# Altium footprint library connectors.PcbLib: 256 footprints (part 7 of 16)
Each footprint in its own frame and in the unit in brackets; x right, y up, seen from the top. Pads: shape width x height; smd on the part's side, far side on the other; paste and mask are expansions set on the pad; w line width, h text height; cw(c..) or ccw(c..) is an arc to the next point about the centre after c.
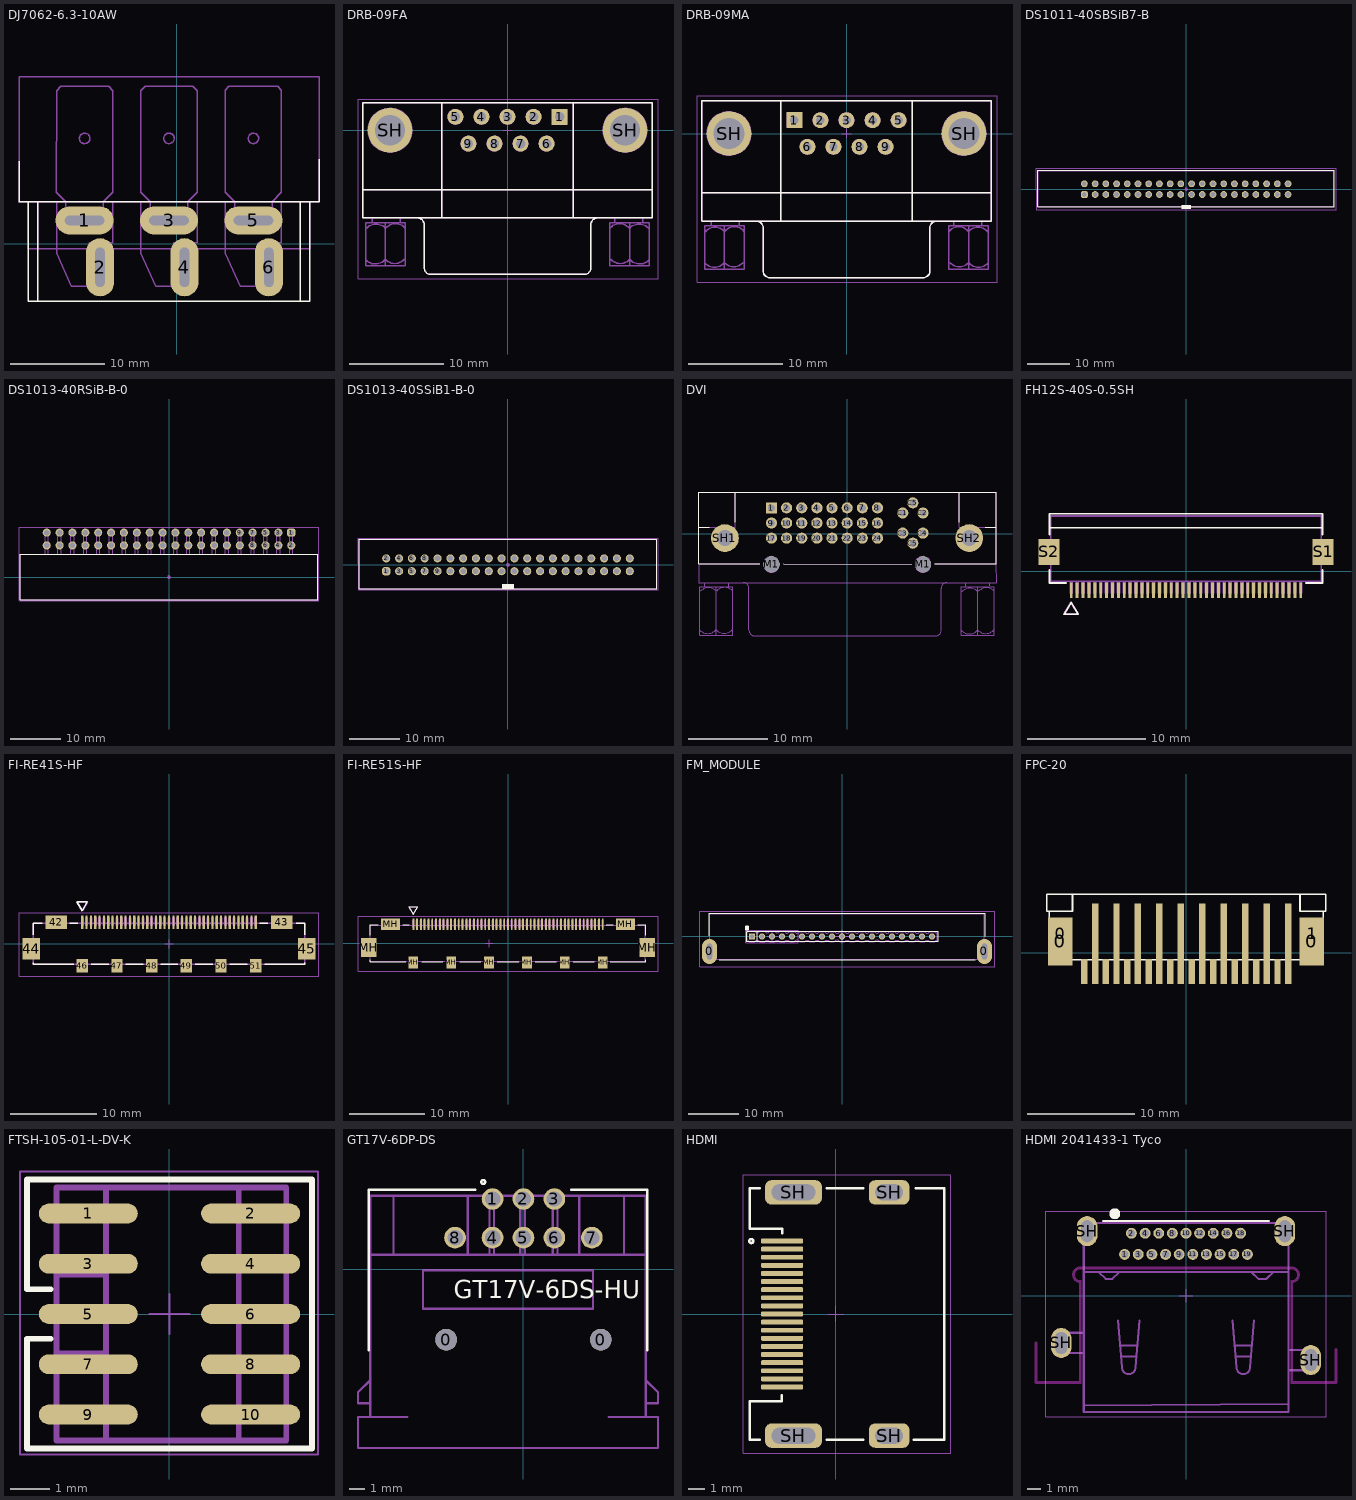
[diagram p6: the footprints below, top view; thin cyan lines are the x and y axes]

## DJ7062-6.3-10AW [mm] "DJ7062-6.3-10AW"
height 18
pads (6):
  oval 6.2x3 hole 1 slot 4.2 at 0 deg: 1(-9.825,2.5) 3(-0.825,2.5) 5(8.175,2.5)
  oval 3x6.2 hole 1 slot 4.2 at 90 deg: 2(-8.175,-2.5) 4(0.825,-2.5) 6(9.825,-2.5)
Top Overlay:
  lines w0.15: -16.825,8.8 -16.825,4.5 ; -15.825,4.5 -15.825,-6.1 14.175,-6.1 14.175,4.5 ; -14.825,-6.1 -14.825,4.5 ; 13.175,-6.1 13.175,4.5 ; 15.175,9 15.175,4.5 -16.825,4.5 ; -16.825,4.5 -16.825,4.5
TopAssy 13:
  circle w0.15: c8.175,11.25 r0.559
  circle w0.15: c-0.825,11.25 r0.559
  circle w0.15: c-9.825,11.25 r0.559
  lines w0.15: -15.825,4.5 -15.825,-0.5 14.175,-0.5 14.175,4.5 ; -14.825,-0.5 -14.825,4.5 ; -12.825,4.5 -12.825,-1 -11.25,-4.5 -7.875,-4.5 -7.875,-0.5 ; -11.825,2.75 -7.825,2.75 ; -9.325,-0.5 -9.325,0.1 -6.825,0.1 -6.825,4.5 ; -8.375,-4.5 -8.375,-0.5 ; -3.825,4.5 -3.825,-1 -2.25,-4.5 1.125,-4.5 1.125,-0.5 ; -2.825,2.75 1.175,2.75 ; -0.325,-0.5 -0.325,0.1 2.175,0.1 2.175,4.5 ; 0.625,-4.5 0.625,-0.5 ; 5.175,4.5 5.175,-1 6.75,-4.5 10.125,-4.5 10.125,-0.5 ; 6.175,2.75 10.175,2.75 ; 8.675,-0.5 8.675,0.1 11.175,0.1 11.175,4.5 ; 9.625,-4.5 9.625,-0.5 ; 13.175,-0.5 13.175,4.5 ; -16.825,4.5 -16.825,17.8 15.175,17.8 15.175,4.5 -16.825,4.5 ; -12.825,5.5 -11.825,4.5 -11.825,2.25 -7.825,2.25 -7.825,4.5 -6.825,5.5 -6.825,16.35 -7.275,16.8 -12.375,16.8 -12.825,16.35 -12.825,5.5 ; -3.825,5.5 -2.825,4.5 -2.825,2.25 1.175,2.25 1.175,4.5 2.175,5.5 2.175,16.35 1.725,16.8 -3.375,16.8 -3.825,16.35 -3.825,5.5 ; 5.175,5.5 5.175,16.4 5.575,16.8 10.775,16.8 11.175,16.4 11.175,5.5 10.175,4.5 10.175,2.25 6.175,2.25 6.175,4.5 5.175,5.5

## DRB-09FA [mm] "Connector, D-Sub R/A  Female Connector, 2.77 mm Pitch"
height 12.4
pads (11):
  rect 1.69x1.69 hole 1: 1(5.54,1.42)
  round 1.69 hole 1: 2(2.77,1.42) 3(0,1.42) 4(-2.77,1.42) 5(-5.54,1.42) 6(4.155,-1.42) 7(1.385,-1.42) 8(-1.385,-1.42) 9(-4.155,-1.42)
  round 4.76 hole 3.2: SH(-12.495,0) SH(12.495,0)
Top Overlay:
  lines w0.15: -15.4,-9.324 15.4,-9.324 15.4,2.9 -15.4,2.9 -15.4,-9.3 ; -15.4,-6.324 15.4,-6.324 ; -9.56,-9.329 cw(c-9.56,-10.024) -8.865,-10.024 -8.865,-14.624 ; -8.86,-14.629 ccw(c-8.165,-14.629) -8.165,-15.324 8.165,-15.324 ccw(c8.165,-14.629) 8.86,-14.629 ; -7,-9.324 -7,2.9 ; 7,-9.3 7,2.9 ; 8.865,-14.624 8.865,-10.024 cw(c9.56,-10.024) 9.56,-9.329
TopAssy 13:
  circle w0.15: c-2.77,1.42 r0.773
  circle w0.15: c0,1.42 r0.773
  circle w0.15: c2.77,1.42 r0.773
  circle w0.15: c-5.54,1.42 r0.773
  circle w0.15: c4.155,-1.42 r0.773
  circle w0.15: c1.385,-1.42 r0.773
  circle w0.15: c-1.385,-1.42 r0.773
  circle w0.15: c-4.155,-1.42 r0.773
  circle w0.15: c-12.495,0 r2.327
  circle w0.15: c12.495,0 r2.327
  lines w0.15: -15.4,-9.324 15.4,-9.324 15.4,2.9 -15.4,2.9 -15.4,-9.3 ; -15.4,-6.324 15.4,-6.324 ; -15.055,-13.779 ccw(c-14.054,-12.872) -13.047,-13.773 ; -14.99,-10.424 cw(c-13.983,-11.325) -12.981,-10.418 ; -14.4,-9.824 -14.4,-9.324 ; -12.998,-13.73 ccw(c-11.997,-12.823) -10.99,-13.724 ; -12.99,-14.424 -12.99,-9.824 ; -12.933,-10.375 cw(c-11.926,-11.276) -10.925,-10.369 ; -11.4,-9.824 -11.4,-9.324 ; -9.56,-9.329 cw(c-9.56,-10.024) -8.865,-10.024 -8.865,-14.624 ; -8.86,-14.629 ccw(c-8.165,-14.629) -8.165,-15.324 8.165,-15.324 ccw(c8.165,-14.629) 8.86,-14.629 ; -7,-9.324 -7,2.9 ; 7,-9.324 7,2.9 ; 8.865,-14.624 8.865,-10.024 cw(c9.56,-10.024) 9.56,-9.329 ; 10.925,-10.369 cw(c11.926,-11.276) 12.933,-10.375 ; 10.99,-13.724 ccw(c11.997,-12.823) 12.999,-13.73 ; 11.4,-9.824 11.4,-9.324 ; 12.981,-10.418 cw(c13.983,-11.325) 14.99,-10.424 ; 12.99,-14.424 12.99,-9.824 ; 13.047,-13.773 ccw(c14.054,-12.872) 15.055,-13.779 ; 14.4,-9.824 14.4,-9.324 ; -15.09,-14.424 -10.89,-14.424 -10.89,-9.824 -15.09,-9.824 -15.09,-14.424 ; 4.79,0.67 4.79,2.17 6.29,2.17 6.29,1.42 6.29,0.67 4.79,0.67 ; 10.89,-14.424 10.89,-9.824 15.09,-9.824 15.09,-14.424 10.89,-14.424
TopCourt 15:
  lines w0.05: -0.5,0 0.5,0 ; 0,-0.5 0,0.5 ; -15.9,-15.8 16,-15.8 16,3.3 -15.9,3.3 -15.9,-15.8
3D body "User Library-DB9-Usa.step": height 12.47, standoff -4.4, extent -15.405,-15.312 15.405,2.988

## DRB-09MA [mm] "Connector, D-Sub R/A  Male Connector, 2.77 mm Pitch"
height 12.5
pads (11):
  rect 1.69x1.69 hole 0.9: 1(-5.54,1.42)
  round 1.69 hole 0.9: 2(-2.77,1.42) 3(0,1.42) 4(2.77,1.42) 5(5.54,1.42) 6(-4.155,-1.42) 7(-1.385,-1.42) 8(1.385,-1.42) 9(4.155,-1.42)
  round 4.76 hole 3.3: SH(-12.495,0) SH(12.495,0)
Top Overlay:
  lines w0.15: -15.4,-9.324 15.4,-9.324 15.4,3.5 -15.4,3.5 -15.4,-9.3 ; -15.4,-6.324 15.4,-6.324 ; -9.56,-9.329 cw(c-9.56,-10.024) -8.865,-10.024 -8.865,-14.624 ; -8.86,-14.629 ccw(c-8.165,-14.629) -8.165,-15.324 8.165,-15.324 ccw(c8.165,-14.629) 8.86,-14.629 ; -7,-9.324 -7,3.5 ; 7,-9.3 7,3.5 ; 8.865,-14.624 8.865,-10.024 cw(c9.56,-10.024) 9.56,-9.329
TopAssy 13:
  circle w0.15: c12.495,0 r2.327
  circle w0.15: c-12.495,0 r2.327
  circle w0.15: c-4.155,-1.42 r0.773
  circle w0.15: c-1.385,-1.42 r0.773
  circle w0.15: c1.385,-1.42 r0.773
  circle w0.15: c4.155,-1.42 r0.773
  circle w0.15: c5.54,1.42 r0.773
  circle w0.15: c2.77,1.42 r0.773
  circle w0.15: c0,1.42 r0.773
  circle w0.15: c-2.77,1.42 r0.773
  lines w0.15: -15.4,-9.324 15.4,-9.324 15.4,3.5 -15.4,3.5 -15.4,-9.3 ; -15.4,-6.324 15.4,-6.324 ; -15.055,-13.779 ccw(c-14.054,-12.872) -13.047,-13.773 ; -14.99,-10.424 cw(c-13.983,-11.325) -12.981,-10.418 ; -14.4,-9.824 -14.4,-9.324 ; -12.999,-13.73 ccw(c-11.997,-12.823) -10.99,-13.724 ; -12.99,-14.424 -12.99,-9.824 ; -12.933,-10.375 cw(c-11.926,-11.276) -10.925,-10.369 ; -11.4,-9.824 -11.4,-9.324 ; -9.56,-9.329 cw(c-9.56,-10.024) -8.865,-10.024 -8.865,-14.624 ; -8.86,-14.629 ccw(c-8.165,-14.629) -8.165,-15.324 8.165,-15.324 ccw(c8.165,-14.629) 8.86,-14.629 ; -7,-9.324 -7,3.5 ; 7,-9.324 7,3.5 ; 8.865,-14.624 8.865,-10.024 cw(c9.56,-10.024) 9.56,-9.329 ; 10.925,-10.369 cw(c11.926,-11.276) 12.933,-10.375 ; 10.99,-13.724 ccw(c11.997,-12.823) 12.999,-13.73 ; 11.4,-9.824 11.4,-9.324 ; 12.981,-10.418 cw(c13.983,-11.325) 14.99,-10.424 ; 12.99,-14.424 12.99,-9.824 ; 13.047,-13.773 ccw(c14.054,-12.872) 15.055,-13.779 ; 14.4,-9.824 14.4,-9.324 ; -15.09,-14.424 -15.09,-9.824 -10.89,-9.824 -10.89,-14.424 -15.09,-14.424 ; -6.29,0.67 -6.29,2.17 -4.79,2.17 -4.79,1.42 -4.79,0.67 -6.29,0.67 ; 10.89,-14.424 15.09,-14.424 15.09,-9.824 10.89,-9.824 10.89,-14.424
TopCourt 15:
  lines w0.05: -0.5,0 0.5,0 ; 0,-0.5 0,0.5 ; -15.9,-15.8 -15.9,4 16,4 16,-15.8 -15.9,-15.8
3D body "User Library-DBPN1M-09.step": height 12.56, standoff -4.81, extent -15.36,-15.717 15.36,3.457

## DS1011-40SBSiB7-B [mm] "Header, Vertical Shrouded, 2.54 mm pitch; 0.64 mm lead width, 40 pins, 2 rows, 20 pins per row, 58.40 mm L X 9.10 mm W X 9.10 mm H body"
height 28
pads (40):
  rrect50% 1.6x1.6 hole 1.1: 1(-24.13,-1.27)
  round 1.6 hole 1.1: 2(-24.13,1.27) 3(-21.59,-1.27) 4(-21.59,1.27) 5(-19.05,-1.27) 6(-19.05,1.27) 7(-16.51,-1.27) 8(-16.51,1.27) 9(-13.97,-1.27) 10(-13.97,1.27) 11(-11.43,-1.27) 12(-11.43,1.27) 13(-8.89,-1.27) 14(-8.89,1.27) 15(-6.35,-1.27) 16(-6.35,1.27) 17(-3.81,-1.27) 18(-3.81,1.27) 19(-1.27,-1.27) 20(-1.27,1.27) 21(1.27,-1.27) 22(1.27,1.27) 23(3.81,-1.27) 24(3.81,1.27) 25(6.35,-1.27) 26(6.35,1.27) 27(8.89,-1.27) 28(8.89,1.27) 29(11.43,-1.27) 30(11.43,1.27) 31(13.97,-1.27) 32(13.97,1.27) 33(16.51,-1.27) 34(16.51,1.27) 35(19.05,-1.27) 36(19.05,1.27) 37(21.59,-1.27) 38(21.59,1.27) 39(24.13,-1.27) 40(24.13,1.27)
Top Overlay:
  rectangle: -1.15,-4.69 1.143,-3.81
  lines w0.125: -35.168,-4.18 35.083,-4.18 35.083,4.466 10.461,4.466 -7.827,4.466 -35.168,4.466 -35.168,-4.18
TopAssy 13:
  rectangle: -1.15,-4.69 1.143,-3.81
  lines w0.125: -35.1,-4.1 -35.1,4.4 -7.893,4.4 10.395,4.4 35,4.4 35,-4.1 -35.1,-4.1
  text "1" at -24.438,-4.191 h1.52
TopCourt 15:
  circle w0.05: c0,0 r0.25
  lines w0.05: -0.35,0 0.35,0 ; 0,-0.35 0,0.35 ; -35.6,-4.925 35.5,-4.925 35.5,5 -35.6,5 -35.6,-4.925
3D body "XG4A_4031.step": height 27.01, standoff -3.19, extent -35.05,-4.1 35.05,4.4

## DS1013-40RSiB-B-0 [mm] "Header, Right Angle Shrouded, 2.54 mm pitch; 0.64 mm lead width, 40 pins, 2 rows, 20 pins per row, 58.4 mm L X 13.80 mm W X 9.10 mm H body"
height 9.1
pads (40):
  rrect50% 1.6x1.6 hole 1.1: 1(24.13,8.805)
  round 1.6 hole 1.1: 2(24.13,6.265) 3(21.59,8.805) 4(21.59,6.265) 5(19.05,8.805) 6(19.05,6.265) 7(16.51,8.805) 8(16.51,6.265) 9(13.97,8.805) 10(13.97,6.265) 11(11.43,8.805) 12(11.43,6.265) 13(8.89,8.805) 14(8.89,6.265) 15(6.35,8.805) 16(6.35,6.265) 17(3.81,8.805) 18(3.81,6.265) 19(1.27,8.805) 20(1.27,6.265) 21(-1.27,8.805) 22(-1.27,6.265) 23(-3.81,8.805) 24(-3.81,6.265) 25(-6.35,8.805) 26(-6.35,6.265) 27(-8.89,8.805) 28(-8.89,6.265) 29(-11.43,8.805) 30(-11.43,6.265) 31(-13.97,8.805) 32(-13.97,6.265) 33(-16.51,8.805) 34(-16.51,6.265) 35(-19.05,8.805) 36(-19.05,6.265) 37(-21.59,8.805) 38(-21.59,6.265) 39(-24.13,8.805) 40(-24.13,6.265)
Top Overlay:
  lines w0.125: -29.305,-4.5 -29.305,4.5 29.305,4.5 29.305,-4.5 -29.305,-4.5
TopAssy 13:
  lines w0.125: -24.45,4.5 -24.45,9.125 -23.81,9.125 -23.81,4.5 ; -21.91,4.5 -21.91,9.125 -21.27,9.125 -21.27,4.5 ; -19.37,4.5 -19.37,9.125 -18.73,9.125 -18.73,4.5 ; -16.83,4.5 -16.83,9.125 -16.19,9.125 -16.19,4.5 ; -14.29,4.5 -14.29,9.125 -13.65,9.125 -13.65,4.5 ; -11.75,4.5 -11.75,9.125 -11.11,9.125 -11.11,4.5 ; -9.21,4.5 -9.21,9.125 -8.57,9.125 -8.57,4.5 ; -6.67,4.5 -6.67,9.125 -6.03,9.125 -6.03,4.5 ; -4.13,4.5 -4.13,9.125 -3.49,9.125 -3.49,4.5 ; -1.59,4.5 -1.59,9.125 -0.95,9.125 -0.95,4.5 ; 0.95,4.5 0.95,9.125 1.59,9.125 1.59,4.5 ; 3.49,4.5 3.49,9.125 4.13,9.125 4.13,4.5 ; 6.03,4.5 6.03,9.125 6.67,9.125 6.67,4.5 ; 8.57,4.5 8.57,9.125 9.21,9.125 9.21,4.5 ; 11.11,4.5 11.11,9.125 11.75,9.125 11.75,4.5 ; 13.65,4.5 13.65,9.125 14.29,9.125 14.29,4.5 ; 16.19,4.5 16.19,9.125 16.83,9.125 16.83,4.5 ; 18.73,4.5 18.73,9.125 19.37,9.125 19.37,4.5 ; 21.27,4.5 21.27,9.125 21.91,9.125 21.91,4.5 ; 23.81,4.5 23.81,9.125 24.45,9.125 24.45,4.5 ; -29.305,-4.5 -29.305,4.5 29.305,4.5 29.305,-4.5 -29.305,-4.5
  text "1" at 25.019,8.497 h1.52
TopCourt 15:
  circle w0.05: c0,0 r0.25
  lines w0.05: -0.35,0 0.35,0 ; 0,-0.35 0,0.35 ; -29.6,-4.7 -29.6,9.9 29.6,9.9 29.6,-4.7 -29.6,-4.7
Top Component Outline:
  drawing of 164 lines, arcs and shapes, not listed
3D body "61204021721.stp": height 9.23, standoff -2.88, extent -29.23,-4.425 29.23,9.125

## DS1013-40SSiB1-B-0 [mm] "Header, Vertical Shrouded, 2.54 mm pitch; 0.64 mm lead width, 40 pins, 2 rows, 20 pins per row, 58.40 mm L X 9.10 mm W X 9.10 mm H body"
height 9.1
pads (40):
  rrect50% 1.6x1.6 hole 1.1: 1(-24.13,-1.27)
  round 1.6 hole 1.1: 2(-24.13,1.27) 3(-21.59,-1.27) 4(-21.59,1.27) 5(-19.05,-1.27) 6(-19.05,1.27) 7(-16.51,-1.27) 8(-16.51,1.27) 9(-13.97,-1.27) 10(-13.97,1.27) 11(-11.43,-1.27) 12(-11.43,1.27) 13(-8.89,-1.27) 14(-8.89,1.27) 15(-6.35,-1.27) 16(-6.35,1.27) 17(-3.81,-1.27) 18(-3.81,1.27) 19(-1.27,-1.27) 20(-1.27,1.27) 21(1.27,-1.27) 22(1.27,1.27) 23(3.81,-1.27) 24(3.81,1.27) 25(6.35,-1.27) 26(6.35,1.27) 27(8.89,-1.27) 28(8.89,1.27) 29(11.43,-1.27) 30(11.43,1.27) 31(13.97,-1.27) 32(13.97,1.27) 33(16.51,-1.27) 34(16.51,1.27) 35(19.05,-1.27) 36(19.05,1.27) 37(21.59,-1.27) 38(21.59,1.27) 39(24.13,-1.27) 40(24.13,1.27)
Top Overlay:
  rectangle: -1.15,-4.69 1.143,-3.81
  lines w0.125: -29.499,-4.699 -29.499,5.024 -7.269,5.024 11.019,5.024 29.499,5.024 29.499,-4.699 9.144,-4.699 -9.144,-4.699 -29.499,-4.699
TopAssy 13:
  rectangle: -1.15,-4.69 1.143,-3.81
  lines w0.125: -29.499,-4.699 -29.499,5.024 -7.269,5.024 11.019,5.024 29.499,5.024 29.499,-4.699 9.144,-4.699 -9.144,-4.699 -29.499,-4.699
  text "1" at -24.438,-4.191 h1.52
TopCourt 15:
  circle w0.05: c0,0 r0.25
  lines w0.05: -0.35,0 0.35,0 ; 0,-0.35 0,0.35 ; -29.725,-4.925 -29.725,5.25 29.725,5.25 29.725,4.75 29.725,-4.925 -29.725,-4.925
Top Component Outline:
  drawing of 168 lines, arcs and shapes, not listed
3D body "61204021621.stp": height 9.13, standoff -2.98, extent -29.23,-4.425 29.23,4.75

## DVI [mm] "DS1091 DVI RECEPTACLE RIGHT ANGLE 24+5(JDR-245)"
height 9.91
pads (34):
  rect 1.4x1.4 hole 0.9: 1(-9.515,3.238)
  round 1.4 hole 0.9: 2(-7.61,3.238) 3(-5.705,3.238) 4(-3.8,3.238) 5(-1.895,3.238) 6(0.01,3.238) 7(1.915,3.238) 8(3.82,3.238) 9(-9.515,1.333) 10(-7.61,1.333) 11(-5.705,1.333) 12(-3.8,1.333) 13(-1.895,1.333) 14(0.01,1.333) 15(1.915,1.333) 16(3.82,1.333) 17(-9.515,-0.572) 18(-7.61,-0.572) 19(-5.705,-0.572) 20(-3.8,-0.572) 21(-1.895,-0.572) 22(0.01,-0.572) 23(1.915,-0.572) 24(3.82,-0.572) C1(6.995,2.603) C2(9.535,2.603) C3(6.995,0.063) C4(9.535,0.063) C5(8.265,-1.207) C5(8.265,3.873)
  round 2 hole 2 unplated: M1(-9.515,-3.872) M1(9.535,-3.872)
  round 3.5 hole 2: SH1(-15.365,-0.572) SH2(15.365,-0.572)
Top Overlay:
  lines w0.15: -18.665,0.818 -17.365,0.818 ; -14.075,1.428 -14.075,5.228 ; -10.965,-3.787 -18.665,-3.787 -18.665,5.228 18.735,5.228 18.735,-3.772 11.035,-3.772 ; -7.965,-3.772 8.035,-3.872 ; 14.075,1.428 14.075,5.228 ; 17.365,0.818 18.735,0.818
TopAssy 13:
  circle w0.15: c9.535,-3.872 r1
  circle w0.15: c-9.515,-3.872 r1
  circle w0.15: c-15.365,-0.572 r1
  circle w0.15: c15.365,-0.572 r1
  lines w0.15: -18.678,-3.773 -18.665,-6.172 18.735,-6.172 18.722,-3.773 ; -18.665,0.818 -14.065,0.818 ; -18.53,-12.127 ccw(c-17.529,-11.221) -16.522,-12.122 ; -18.465,-7.272 cw(c-17.458,-8.173) -16.456,-7.267 ; -17.875,-6.672 -17.875,-6.172 ; -16.474,-12.078 ccw(c-15.472,-11.172) -14.465,-12.072 ; -16.465,-12.772 -16.465,-6.672 ; -16.408,-7.223 cw(c-15.401,-8.124) -14.4,-7.218 ; -14.875,-6.672 -14.875,-6.172 ; -14.075,0.818 -14.075,5.228 ; -13.04,-6.178 cw(c-13.04,-6.873) -12.345,-6.873 -12.345,-12.177 ; -12.34,-12.177 ccw(c-11.645,-12.177) -11.645,-12.872 11.135,-12.872 ccw(c11.135,-12.177) 11.83,-12.177 ; -10.965,-3.787 -18.665,-3.787 -18.665,5.228 18.735,5.228 18.735,-3.772 11.035,-3.772 ; -7.965,-3.772 8.035,-3.872 ; 11.835,-12.177 11.835,-6.873 cw(c12.53,-6.873) 12.53,-6.178 ; 14.075,5.228 14.075,0.828 14.085,0.818 18.735,0.818 ; 14.37,-12.177 ccw(c15.371,-11.271) 16.378,-12.172 ; 14.435,-7.322 cw(c15.442,-8.223) 16.444,-7.317 ; 14.935,-6.673 14.935,-6.272 ; 16.426,-12.128 ccw(c17.428,-11.222) 18.435,-12.122 ; 16.435,-12.772 16.435,-6.672 ; 16.492,-7.273 cw(c17.499,-8.174) 18.5,-7.268 ; 17.935,-6.573 17.935,-6.172 ; -18.565,-12.772 -18.565,-6.672 -14.365,-6.672 -14.365,-12.772 -18.565,-12.772 ; 14.335,-12.772 18.535,-12.772 18.535,-6.672 14.335,-6.672 14.335,-12.772
3D body "c-1-1734147-2-a-3d.stp": height 10.95, standoff -2.77, extent -18.645,-12.809 18.615,5.133

## FH12S-40S-0.5SH [mm] "0.5mm and 1mm Pitch Connectors For FPC/FFC"
pads (42):
  rect 0.245x1.3 smd mask+0.075: 1(-9.75,-1.625) 2(-9.25,-1.625) 3(-8.75,-1.625) 4(-8.25,-1.625) 5(-7.75,-1.625) 6(-7.25,-1.625) 7(-6.75,-1.625) 8(-6.25,-1.625) 9(-5.75,-1.625) 10(-5.25,-1.625) 11(-4.75,-1.625) 12(-4.25,-1.625) 13(-3.75,-1.625) 14(-3.25,-1.625) 15(-2.75,-1.625) 16(-2.25,-1.625) 17(-1.75,-1.625) 18(-1.25,-1.625) 19(-0.75,-1.625) 20(-0.25,-1.625) 21(0.25,-1.625) 22(0.75,-1.625) 23(1.25,-1.625) 24(1.75,-1.625) 25(2.25,-1.625) 26(2.75,-1.625) 27(3.25,-1.625) 28(3.75,-1.625) 29(4.25,-1.625) 30(4.75,-1.625) 31(5.25,-1.625) 32(5.75,-1.625) 33(6.25,-1.625) 34(6.75,-1.625) 35(7.25,-1.625) 36(7.75,-1.625) 37(8.25,-1.625) 38(8.75,-1.625) 39(9.25,-1.625) 40(9.75,-1.625)
  rect 1.8x2.2 smd: S1(11.65,1.625) S2(-11.65,1.625)
Top Overlay:
  lines w0.15: -11.6,0.1 -11.6,-1.025 -10.2,-1.025 ; -11.6,3.1 -11.6,4.875 11.6,4.875 11.6,3.1 ; -11.6,3.675 11.6,3.675 ; 10.2,-1.025 11.6,-1.025 11.6,0.1 ; -10.36,-3.675 -9.16,-3.675 -9.76,-2.675 -10.36,-3.675
TopAssy 13:
  lines w0.15: -9.837,-0.875 -9.837,-1.875 -9.663,-1.875 -9.663,-0.875 ; -9.337,-0.875 -9.337,-1.875 -9.162,-1.875 -9.162,-0.875 ; -8.837,-0.875 -8.837,-1.875 -8.662,-1.875 -8.662,-0.875 ; -8.337,-0.875 -8.337,-1.875 -8.162,-1.875 -8.162,-0.875 ; -7.838,-0.875 -7.837,-1.875 -7.663,-1.875 -7.663,-0.875 ; -7.337,-0.875 -7.337,-1.875 -7.163,-1.875 -7.163,-0.875 ; -6.837,-0.875 -6.837,-1.875 -6.662,-1.875 -6.662,-0.875 ; -6.337,-0.875 -6.337,-1.875 -6.162,-1.875 -6.162,-0.875 ; -5.837,-0.875 -5.837,-1.875 -5.663,-1.875 -5.663,-0.875 ; -5.338,-0.875 -5.338,-1.875 -5.163,-1.875 -5.163,-0.875 ; -4.837,-0.875 -4.837,-1.875 -4.663,-1.875 -4.663,-0.875 ; -4.337,-0.875 -4.337,-1.875 -4.162,-1.875 -4.162,-0.875 ; -3.837,-0.875 -3.837,-1.875 -3.662,-1.875 -3.662,-0.875 ; -3.337,-0.875 -3.337,-1.875 -3.163,-1.875 -3.163,-0.875 ; -2.838,-0.875 -2.838,-1.875 -2.663,-1.875 -2.663,-0.875 ; -2.337,-0.875 -2.337,-1.875 -2.163,-1.875 -2.163,-0.875 ; -1.837,-0.875 -1.837,-1.875 -1.662,-1.875 -1.662,-0.875 ; -1.337,-0.875 -1.337,-1.875 -1.162,-1.875 -1.162,-0.875 ; -0.837,-0.875 -0.838,-1.875 -0.663,-1.875 -0.663,-0.875 ; -0.337,-0.875 -0.338,-1.875 -0.163,-1.875 -0.163,-0.875 ; 0.163,-0.875 0.163,-1.875 0.338,-1.875 0.337,-0.875 ; 0.663,-0.875 0.663,-1.875 0.838,-1.875 0.838,-0.875 ; 1.163,-0.875 1.163,-1.875 1.338,-1.875 1.338,-0.875 ; 1.663,-0.875 1.663,-1.875 1.837,-1.875 1.837,-0.875 ; 2.163,-0.875 2.163,-1.875 2.337,-1.875 2.337,-0.875 ; 2.663,-0.875 2.663,-1.875 2.838,-1.875 2.838,-0.875 ; 3.163,-0.875 3.163,-1.875 3.337,-1.875 3.337,-0.875 ; 3.663,-0.875 3.663,-1.875 3.838,-1.875 3.838,-0.875 ; 4.163,-0.875 4.163,-1.875 4.337,-1.875 4.337,-0.875 ; 4.663,-0.875 4.663,-1.875 4.837,-1.875 4.837,-0.875 ; 5.163,-0.875 5.163,-1.875 5.338,-1.875 5.338,-0.875 ; 5.663,-0.875 5.663,-1.875 5.837,-1.875 5.837,-0.875 ; 6.163,-0.875 6.163,-1.875 6.338,-1.875 6.338,-0.875 ; 6.663,-0.875 6.663,-1.875 6.837,-1.875 6.837,-0.875 ; 7.163,-0.875 7.163,-1.875 7.337,-1.875 7.337,-0.875 ; 7.663,-0.875 7.663,-1.875 7.837,-1.875 7.838,-0.875 ; 8.163,-0.875 8.163,-1.875 8.337,-1.875 8.337,-0.875 ; 8.663,-0.875 8.663,-1.875 8.838,-1.875 8.838,-0.875 ; 9.163,-0.875 9.163,-1.875 9.337,-1.875 9.337,-0.875 ; 9.663,-1.875 9.838,-1.875 ; 9.663,-1.875 9.663,-0.875 9.663,-1.875 ; 9.663,-1.875 9.837,-1.875 ; 9.838,-1.875 9.838,-0.875 9.837,-1.875 ; -12.15,0.875 -10.95,0.875 -10.95,2.375 -12.15,2.375 -12.15,0.875 ; -11.5,-0.875 -11.5,4.675 11.5,4.675 11.5,-0.875 -11.5,-0.875 ; -10.39,-3.65 -9.79,-2.65 -9.19,-3.65 -10.39,-3.65 ; 10.85,0.875 10.85,2.375 12.05,2.375 12.05,0.875 10.85,0.875
3D body "FH12S-40S-0.5SH.stp": height 2.39, standoff -0.01, extent -12.05,-1.725 12.05,4.675

## FI-RE41S-HF [mm] "FI-RE41S-HF 0.5mm High Speed Differential Transmission Connectors"
height 3.75
pads (51):
  rect 0.25x1.55 smd: 1(-10,2.525) 2(-9.5,2.525) 3(-9,2.525) 4(-8.5,2.525) 5(-8,2.525) 6(-7.5,2.525) 7(-7,2.525) 8(-6.5,2.525) 9(-6,2.525) 10(-5.5,2.525) 11(-5,2.525) 12(-4.5,2.525) 13(-4,2.525) 14(-3.5,2.525) 15(-3,2.525) 16(-2.5,2.525) 17(-2,2.525) 18(-1.5,2.525) 19(-1,2.525) 20(-0.5,2.525) 21(0,2.525) 22(0.5,2.525) 23(1,2.525) 24(1.5,2.525) 25(2,2.525) 26(2.5,2.525) 27(3,2.525) 28(3.5,2.525) 29(4,2.525) 30(4.5,2.525) 31(5,2.525) 32(5.5,2.525) 33(6,2.525) 34(6.5,2.525) 35(7,2.525) 36(7.5,2.525) 37(8,2.525) 38(8.5,2.525) 39(9,2.525) 40(9.5,2.525) 41(10,2.525)
  rect 2.5x1.55 smd: 42(-13,2.525) 43(13,2.525)
  rect 2.05x2.5 smd: 44(-15.9,-0.55) 45(15.9,-0.55)
  rect 1.3x1.55 smd: 46(-10,-2.525) 47(-6,-2.525) 48(-2,-2.525) 49(2,-2.525) 50(6,-2.525) 51(10,-2.525)
Top Overlay:
  lines w0.15: -15.675,-2.15 -15.675,-2.35 -10.975,-2.35 ; -15.675,1.075 -15.675,2.375 -14.625,2.375 ; -11.425,2.375 -10.525,2.375 ; -8.975,-2.35 -6.975,-2.35 ; -4.975,-2.35 -2.975,-2.35 ; -0.975,-2.35 1.025,-2.35 ; 3.025,-2.35 5.025,-2.35 ; 7.025,-2.35 9.025,-2.35 ; 10.475,2.375 11.375,2.375 ; 11.025,-2.35 15.675,-2.35 15.675,-2.15 ; 14.65,2.375 15.675,2.375 15.675,1.075 ; -10.625,4.85 -10.025,3.85 -9.425,4.85 -10.625,4.85
TopAssy 13:
  drawing of 211 lines, arcs and shapes, not listed
TopCourt 15:
  lines w0.05: -0.5,0 0.5,0 ; 0,-0.5 0,0.5 ; -17.3,-3.7 -17.3,3.6 17.3,3.6 17.3,-3.7 -17.3,-3.7
3D body: height 0.08, standoff 0, extent 15.676,-1.299 16.424,0.199
3D body: height 0.08, standoff 0, extent -16.424,-1.299 -15.676,0.199
3D body: height 0.08, standoff 0, extent -13.749,2.376 -12.251,3.049
3D body: height 0.08, standoff 0, extent 12.251,2.376 13.749,3.049
3D body: height 0.08, standoff 0, extent -10.249,-3.049 -9.751,-2.351
3D body: height 0.08, standoff 0, extent 9.751,-3.049 10.249,-2.351
3D body: height 0.08, standoff 0, extent 1.751,-3.049 2.249,-2.351
3D body: height 0.08, standoff 0, extent -2.249,-3.049 -1.751,-2.351
3D body: height 0.08, standoff 0, extent 5.751,-3.049 6.249,-2.351
3D body: height 0.08, standoff 0, extent -6.249,-3.049 -5.751,-2.351
3D body: height 0.08, standoff 0, extent -5.089,2.376 -4.911,3.049
3D body: height 0.08, standoff 0, extent 3.911,2.376 4.089,3.049
3D body: height 0.08, standoff 0, extent 2.911,2.376 3.089,3.049
3D body: height 0.08, standoff 0, extent -2.089,2.376 -1.911,3.049
3D body: height 0.08, standoff 0, extent -7.089,2.376 -6.911,3.049
3D body: height 0.08, standoff 0, extent 3.411,2.376 3.589,3.049
3D body: height 0.08, standoff 0, extent 5.911,2.376 6.089,3.049
3D body: height 0.08, standoff 0, extent -1.589,2.376 -1.411,3.049
3D body: height 0.08, standoff 0, extent -1.089,2.376 -0.911,3.049
3D body: height 0.08, standoff 0, extent 2.411,2.376 2.589,3.049
3D body: height 0.08, standoff 0, extent -4.089,2.376 -3.911,3.049
3D body: height 0.08, standoff 0, extent -9.589,2.376 -9.411,3.049
3D body: height 0.08, standoff 0, extent 0.411,2.376 0.589,3.049
3D body: height 0.08, standoff 0, extent -7.589,2.376 -7.411,3.049
3D body: height 0.08, standoff 0, extent 5.411,2.376 5.589,3.049
3D body: height 0.08, standoff 0, extent 4.911,2.376 5.089,3.049
3D body: height 0.08, standoff 0, extent -3.589,2.376 -3.411,3.049
3D body: height 0.08, standoff 0, extent 1.411,2.376 1.589,3.049
3D body: height 0.08, standoff 0, extent -3.089,2.376 -2.911,3.049
3D body: height 0.08, standoff 0, extent -8.589,2.376 -8.411,3.049
3D body: height 0.08, standoff 0, extent -0.089,2.376 0.089,3.049
3D body: height 0.08, standoff 0, extent -6.589,2.376 -6.411,3.049
3D body: height 0.08, standoff 0, extent 4.411,2.376 4.589,3.049
3D body: height 0.08, standoff 0, extent -6.089,2.376 -5.911,3.049
3D body: height 0.08, standoff 0, extent 8.411,2.376 8.589,3.049
3D body: height 0.08, standoff 0, extent -0.589,2.376 -0.411,3.049
3D body: height 0.08, standoff 0, extent 7.411,2.376 7.589,3.049
3D body: height 0.08, standoff 0, extent 9.411,2.376 9.589,3.049
3D body: height 0.08, standoff 0, extent -5.589,2.376 -5.411,3.049
3D body: height 0.08, standoff 0, extent 6.911,2.376 7.089,3.049
3D body: height 0.08, standoff 0, extent 9.911,2.376 10.089,3.049
3D body: height 0.08, standoff 0, extent 1.911,2.376 2.089,3.049
3D body: height 0.08, standoff 0, extent 8.911,2.376 9.089,3.049
3D body: height 0.08, standoff 0, extent -2.589,2.376 -2.411,3.049
3D body: height 0.08, standoff 0, extent -4.589,2.376 -4.411,3.049
3D body: height 0.08, standoff 0, extent -8.089,2.376 -7.911,3.049
3D body: height 0.08, standoff 0, extent -9.089,2.376 -8.911,3.049
3D body: height 0.08, standoff 0, extent 0.911,2.376 1.089,3.049
3D body: height 0.08, standoff 0, extent 7.911,2.376 8.089,3.049
3D body: height 0.08, standoff 0, extent -10.089,2.376 -9.911,3.049
3D body: height 0.08, standoff 0, extent 6.411,2.376 6.589,3.049
3D body: height 3.75, standoff 0, extent -15.674,-2.349 15.674,2.374

## FI-RE51S-HF [mm] "FI-RE51S-HF 0.5mm High Speed Differential Transmission Connectors"
height 3.75
pads (61):
  rect 0.25x1.55 smd: 1(-12.5,2.525) 2(-12,2.525) 3(-11.5,2.525) 4(-11,2.525) 5(-10.5,2.525) 6(-10,2.525) 7(-9.5,2.525) 8(-9,2.525) 9(-8.5,2.525) 10(-8,2.525) 11(-7.5,2.525) 12(-7,2.525) 13(-6.5,2.525) 14(-6,2.525) 15(-5.5,2.525) 16(-5,2.525) 17(-4.5,2.525) 18(-4,2.525) 19(-3.5,2.525) 20(-3,2.525) 21(-2.5,2.525) 22(-2,2.525) 23(-1.5,2.525) 24(-1,2.525) 25(-0.5,2.525) 26(0,2.525) 27(0.5,2.525) 28(1,2.525) 29(1.5,2.525) 30(2,2.525) 31(2.5,2.525) 32(3,2.525) 33(3.5,2.525) 34(4,2.525) 35(4.5,2.525) 36(5,2.525) 37(5.5,2.525) 38(6,2.525) 39(6.5,2.525) 40(7,2.525) 41(7.5,2.525) 42(8,2.525) 43(8.5,2.525) 44(9,2.525) 45(9.5,2.525) 46(10,2.525) 47(10.5,2.525) 48(11,2.525) 49(11.5,2.525) 50(12,2.525) 51(12.5,2.525)
  rect 2.05x2.5 smd: MH(-18.4,-0.55) MH(18.4,-0.55)
  rect 2.5x1.55 smd: MH(-15.5,2.525) MH(15.5,2.525)
  rect 1.3x1.55 smd: MH(-12.5,-2.525) MH(-7.5,-2.525) MH(-2.5,-2.525) MH(2.5,-2.525) MH(7.5,-2.525) MH(12.5,-2.525)
Top Overlay:
  lines w0.15: -18.2,-2.15 -18.2,-2.425 -13.475,-2.425 ; -18.2,1.075 -18.2,2.475 -17.125,2.475 ; -13.925,2.475 -13.025,2.475 ; -11.4,-2.425 -8.6,-2.425 ; -6.4,-2.425 -3.6,-2.425 ; -1.4,-2.425 1.4,-2.425 ; 3.6,-2.425 6.4,-2.425 ; 8.6,-2.425 11.4,-2.425 ; 12.975,2.475 13.875,2.475 ; 13.525,-2.425 18.175,-2.425 18.175,-2.15 ; 17.15,2.475 18.175,2.475 18.175,1.075 ; -13.125,4.85 -11.925,4.85 -12.525,3.85 -13.125,4.85
TopAssy 13:
  drawing of 255 lines, arcs and shapes, not listed
TopCourt 15:
  lines w0.05: -3,0 -2,0 ; -2.5,-0.5 -2.5,0.5 ; -19.8,-3.7 19.8,-3.7 19.8,3.6 -19.8,3.6 -19.8,-3.7
3D body: height 3.75, standoff 0, extent -18.174,-2.349 18.2,2.376
3D body: height 0.08, standoff 0, extent 3.911,2.376 4.089,3.049
3D body: height 0.08, standoff 0, extent -12.589,2.376 -12.411,3.049
3D body: height 0.08, standoff 0, extent 5.411,2.376 5.589,3.049
3D body: height 0.08, standoff 0, extent -1.589,2.376 -1.411,3.049
3D body: height 0.08, standoff 0, extent -11.589,2.376 -11.411,3.049
3D body: height 0.08, standoff 0, extent -10.589,2.376 -10.411,3.049
3D body: height 0.08, standoff 0, extent -7.089,2.376 -6.911,3.049
3D body: height 0.08, standoff 0, extent -5.089,2.376 -4.911,3.049
3D body: height 0.08, standoff 0, extent 6.411,2.376 6.589,3.049
3D body: height 0.08, standoff 0, extent -0.589,2.376 -0.411,3.049
3D body: height 0.08, standoff 0, extent 7.411,2.376 7.589,3.049
3D body: height 0.08, standoff 0, extent 4.411,2.376 4.589,3.049
3D body: height 0.08, standoff 0, extent -8.089,2.376 -7.911,3.049
3D body: height 0.08, standoff 0, extent 6.911,2.376 7.089,3.049
3D body: height 0.08, standoff 0, extent 4.911,2.376 5.089,3.049
3D body: height 0.08, standoff 0, extent -3.089,2.376 -2.911,3.049
3D body: height 0.08, standoff 0, extent 5.911,2.376 6.089,3.049
3D body: height 0.08, standoff 0, extent -8.589,2.376 -8.411,3.049
3D body: height 0.08, standoff 0, extent 1.911,2.376 2.089,3.049
3D body: height 0.08, standoff 0, extent -9.089,2.376 -8.911,3.049
3D body: height 0.08, standoff 0, extent -2.589,2.376 -2.411,3.049
3D body: height 0.08, standoff 0, extent -11.089,2.376 -10.911,3.049
3D body: height 0.08, standoff 0, extent -5.589,2.376 -5.411,3.049
3D body: height 0.08, standoff 0, extent -1.089,2.376 -0.911,3.049
3D body: height 0.08, standoff 0, extent -6.089,2.376 -5.911,3.049
3D body: height 0.08, standoff 0, extent 2.411,2.376 2.589,3.049
3D body: height 0.08, standoff 0, extent 2.911,2.376 3.089,3.049
3D body: height 0.08, standoff 0, extent -10.089,2.376 -9.911,3.049
3D body: height 0.08, standoff 0, extent -2.089,2.376 -1.911,3.049
3D body: height 0.08, standoff 0, extent -12.089,2.376 -11.911,3.049
3D body: height 0.08, standoff 0, extent -6.589,2.376 -6.411,3.049
3D body: height 0.08, standoff 0, extent -0.089,2.376 0.089,3.049
3D body: height 0.08, standoff 0, extent -3.589,2.376 -3.411,3.049
3D body: height 0.08, standoff 0, extent -4.089,2.376 -3.911,3.049
3D body: height 0.08, standoff 0, extent 3.411,2.376 3.589,3.049
3D body: height 0.08, standoff 0, extent 0.911,2.376 1.089,3.049
3D body: height 0.08, standoff 0, extent -9.589,2.376 -9.411,3.049
3D body: height 0.08, standoff 0, extent -4.589,2.376 -4.411,3.049
3D body: height 0.08, standoff 0, extent 0.411,2.376 0.589,3.049
3D body: height 0.08, standoff 0, extent 1.411,2.376 1.589,3.049
3D body: height 0.08, standoff 0, extent -7.589,2.376 -7.411,3.049
3D body: height 0.08, standoff 0, extent -7.749,-3.049 -7.251,-2.351
3D body: height 0.08, standoff 0, extent 2.251,-3.049 2.749,-2.351
3D body: height 0.08, standoff 0, extent -2.749,-3.049 -2.251,-2.351
3D body: height 0.08, standoff 0, extent 7.251,-3.049 7.749,-2.351
3D body: height 0.08, standoff 0, extent -12.749,-3.049 -12.251,-2.351
3D body: height 0.08, standoff 0, extent -16.249,2.376 -14.751,3.049
3D body: height 0.08, standoff 0, extent -18.924,-1.299 -18.176,0.199
3D body: height 0.08, standoff 0, extent 18.176,-1.299 18.924,0.199
3D body: height 0.08, standoff 0, extent 14.751,2.376 16.249,3.049
3D body: height 0.08, standoff 0, extent 12.251,-3.049 12.749,-2.351
3D body: height 0.08, standoff 0, extent 8.411,2.376 8.589,3.049
3D body: height 0.08, standoff 0, extent 7.911,2.376 8.089,3.049
3D body: height 0.08, standoff 0, extent 7.411,2.376 7.589,3.049
3D body: height 0.08, standoff 0, extent 10.911,2.376 11.089,3.049
3D body: height 0.08, standoff 0, extent 9.911,2.376 10.089,3.049
3D body: height 0.08, standoff 0, extent 11.911,2.376 12.089,3.049
3D body: height 0.08, standoff 0, extent 9.411,2.376 9.589,3.049
3D body: height 0.08, standoff 0, extent 12.411,2.376 12.589,3.049
3D body: height 0.08, standoff 0, extent 11.411,2.376 11.589,3.049
3D body: height 0.08, standoff 0, extent 10.411,2.376 10.589,3.049
3D body: height 0.08, standoff 0, extent 8.911,2.376 9.089,3.049

## FM_MODULE [mm] "FM_MODULE QSD-RT-6686 www.szqsd.cn"
height 25
pads (21):
  oval 3x5 hole 1 slot 3.2 at 90 deg: 0(-26.5,-3) 0(28.5,-3)
  rect 1.2x1.2 hole 0.8: 1(-18,0)
  round 1.2 hole 0.8: 2(-16,0) 3(-14,0) 4(-12,0) 5(-10,0) 6(-8,0) 7(-6,0) 8(-4,0) 9(-2,0) 10(0,0) 11(2,0) 12(4,0) 13(6,0) 14(8,0) 15(10,0) 16(12,0) 17(14,0) 18(16,0) 19(18,0)
Top Overlay:
  circle w0.2: c-19,1.7 r0.2
  circle w0.2: c-19,1.7 r0.103
  circle w0.2: c-19,1.7 r0.4
  lines w0.15: -26.6,0.1 -26.6,4.6 28.6,4.6 28.6,0 ; -24.6,-4.6 26.6,-4.6 ; -19.008,-1.008 -19.008,0.992 ; -19.008,-1 19.2,-1 19.2,1 -19.008,1 ; -17,-1 -17,1 -17.05,1 -16.975,1
TopAssy 13:
  drawing of 243 lines, arcs and shapes, not listed
TopCourt 15:
  lines w0.05: -15,0 -13,0 ; -14,-1 -14,1 ; -1.3,0 1.3,0 ; 0,-1.3 0,1.3 ; -28.5,-6 30.5,-6 30.5,5 -28.5,5 -28.5,-6 ; -19.25,-1.25 -19.25,1.25 -8.8,1.25 -8.8,-1.25 -19.25,-1.25
3D body "User Library-pls2-5_asm-1.STEP": height 6.1, standoff -2.7, extent 9,-1 19,1
3D body "User Library-pls2-5_asm-1.STEP": height 6.1, standoff -2.7, extent 1,-1 11,1
3D body "User Library-pls2-5_asm-1.STEP": height 6.1, standoff -2.7, extent -9,-1 1,1
3D body: height 25, standoff -2, extent 28.501,-4.499 28.799,-1.501
3D body: height 25, standoff -2, extent 28.201,-4.499 28.499,-1.501
3D body: height 25, standoff -2, extent -26.499,-4.499 -26.201,-1.501
3D body: height 25, standoff -2, extent -26.799,-4.499 -26.501,-1.501
3D body: height 25, standoff 2, extent -26.675,-4.675 28.675,4.675
3D body "User Library-pls2-5_asm-1.STEP": height 6.1, standoff -2.7, extent -19,-1 -9,1

## FPC-20 [mm] "1.0mm ZIF FPC right angel(upper contact pads)"
height 2.7
pads (24):
  rect 2.3x4.5 smd: 0(-11.75,1.05) 0(11.7,1.05)
  rect 2x2 on Top Overlay: 0(-11.75,1.75) 1(11.75,1.75)
  rect 0.6x2.3 smd: 1(-9.5,-1.75) 3(-7.5,-1.75) 5(-5.5,-1.75) 7(-3.5,-1.75) 9(-1.5,-1.75) 11(0.5,-1.75) 13(2.5,-1.75) 15(4.5,-1.75) 17(6.5,-1.75) 19(8.5,-1.75)
  rect 0.6x7.5 smd: 2(-8.5,0.85) 4(-6.5,0.85) 6(-4.5,0.85) 8(-2.5,0.85) 10(-0.5,0.85) 12(1.5,0.85) 14(3.5,0.85) 16(5.5,0.85) 18(7.5,0.85) 20(9.5,0.85)
Top Overlay:
  lines w0.15: -10.6,5.45 -10.6,3.85 -12.75,3.85 ; -9.504,-0.65 -8.996,-0.65 ; 10.6,5.45 10.6,3.85 13,3.85 ; -12.75,3.85 -12.75,-0.65 12.75,-0.65 12.75,3.85 13,3.85 ; -12.75,3.85 -13,3.85 -13,5.45 12.75,5.45 13,5.45 13,3.85

## FTSH-105-01-L-DV-K [mm] "FTSH-105-01-L-DV-K 10 Positions Header, Cuttable Connector 0.050\" (1.27mm) Surface Mount Gold"
pads (10):
  oval 2.5x0.5 smd: 1(-2.05,2.54) 2(2.05,2.54) 3(-2.05,1.27) 4(2.05,1.27) 5(-2.05,0) 6(2.05,0) 7(-2.05,-1.27) 8(2.05,-1.27) 9(-2.05,-2.54) 10(2.05,-2.54)
Top Overlay:
  lines w0.15: -3,-0.625 -3.6,-0.625 -3.6,-3.4 3.6,-3.4 3.6,3.4 -3.6,3.4 -3.6,0.625 -3,0.625
  text "." at -3.3,3.4 h1.52
TopAssy 13:
  lines w0.15: -2.85,-1 -1.6,-1 ; -2.85,1 -1.6,1 ; -1.6,-3.2 -1.6,-1 ; -1.6,3.2 -1.6,1 ; 1.75,-3.2 1.75,3.2 ; -1.6,-1 -1.6,1 ; -2.85,-3.2 2.95,-3.2 2.95,3.2 -2.85,3.2 -2.85,-3.2
TopCourt 15:
  lines w0.05: -0.5,0 0.5,0 ; 0,-0.5 0,0.5 ; -3.775,-3.55 -3.775,3.6 3.75,3.6 3.75,-3.55 -3.775,-3.55
3D body "FTSH-105-01-L-DV-K.stp": height 6.21, standoff 0.09, extent -2.971,-3.175 2.871,3.175

## GT17V-6DP-DS [mm] "Automotive LAN Connector , Thru-Hole; Right Angle"
height 10.95
pads (10):
  round 1.4 hole 1.4 unplated: 0(-5,-4.55) 0(5,-4.55)
  round 1.4 hole 1: 1(-2,4.55) 2(0,4.55) 3(2,4.55) 4(-2,2.05) 5(0,2.05) 6(2,2.05) 7(4.425,2.05) 8(-4.425,2.05)
Top Overlay:
  circle w0.15: c-2.6,5.65 r0.125
  lines w0.15: -10,-5.25 -10,5.15 -3.1,5.15 ; 3.1,5.15 8,5.15 8,-5.25
  text "GT17V-6DS-HU" at -4.5,-2.25 h2
TopAssy 13:
  lines w0.15: -9.9,-8.65 -10.7,-8.65 -10.7,-7.95 -9.9,-7.15 ; -9.9,0.95 7.9,0.95 ; -8.4,0.95 -8.4,4.75 ; -7.5,-9.55 -9.9,-9.55 ; -3.6,0.95 -3.6,4.75 ; -2.2,0.95 -2.2,4.45 -1.9,4.45 -1.9,0.95 ; -0.2,0.95 -0.2,4.45 0.1,4.45 0.1,0.95 ; 1.9,0.95 1.9,4.45 2.2,4.45 2.2,0.95 ; 3.6,0.95 3.6,4.75 ; 5.5,-9.55 7.9,-9.55 ; 6.5,0.95 6.5,4.75 ; 7.9,-8.65 8.7,-8.65 8.7,-7.95 7.9,-7.15 ; -9.9,-9.55 -9.9,4.75 7.9,4.75 7.9,-9.55 ; -9.9,-9.55 -10.7,-9.55 -10.7,-11.55 8.7,-11.55 8.7,-9.55 7.9,-9.55 ; -6.5,-2.55 -6.5,-0.05 4.5,-0.05 4.5,-2.55 -6.5,-2.55
3D body "GT17V-6DP-DS.stp": height 15.73, standoff -2.97, extent -10.7,-11.55 8.7,4.95

## HDMI [mm]
height 6.2
pads (23):
  rrect50% 2.6x0.3 smd mask+0.05: 1(-3.3,4.5) 2(-3.3,4) 3(-3.3,3.5) 4(-3.3,3) 5(-3.3,2.5) 6(-3.3,2) 7(-3.3,1.5) 8(-3.3,1) 9(-3.3,0.5) 10(-3.3,0) 11(-3.3,-0.5) 12(-3.3,-1) 13(-3.3,-1.5) 14(-3.3,-2) 15(-3.3,-2.5) 16(-3.3,-3) 17(-3.3,-3.5) 18(-3.3,-4) 19(-3.3,-4.5)
  rrect50% 3.5x1.5 hole 1 slot 2.7 at 0 deg: SH(-2.6,-7.5) SH(-2.6,7.5)
  rrect50% 2.5x1.5 hole 1 slot 1.7 at 0 deg: SH(3.3,7.5) SH(3.3,-7.5)
Top Overlay:
  circle w0.15: c-5.2,4.5 r0.125
  lines w0.15: -4.675,-7.75 -5.3,-7.75 -5.3,-5.375 -3.325,-5.375 -3.325,-5 ; -4.675,7.75 -5.3,7.75 -5.3,5.25 -3.3,5.25 -3.3,4.975 ; -0.55,-7.75 1.7,-7.75 ; -0.55,7.75 1.7,7.75 ; 4.825,-7.75 6.7,-7.75 6.7,7.75 4.925,7.75
TopAssy 13:
TopCourt 15:
  lines w0.05: -0.5,0 0.5,0 ; 0,-0.475 0,0.475 ; -5.7,-8.6 -5.7,8.6 7.1,8.6 7.1,-8.6 -5.7,-8.6

## HDMI 2041433-1 Tyco [mm] "HDMI Connector Type A RCPT RVS Offset DIP"
pads (23):
  round 0.8 hole 0.55 mask+0.05: 1(-4.499,3.025) 3(-3.499,3.025) 5(-2.499,3.025) 7(-1.499,3.025) 9(-0.5,3.025) 11(0.5,3.025) 13(1.5,3.025) 15(2.5,3.025) 17(3.5,3.025) 19(4.5,3.025)
  round 0.8 / inner round 0.55 / far side round 0.8 hole 0.55 mask+0.05: 2(-3.999,4.575) 4(-2.999,4.575) 6(-1.999,4.575) 8(-0.999,4.575) 10(0.001,4.575) 12(1.001,4.575) 14(2,4.575) 16(3,4.575) 18(4,4.575)
  oval 1.5x2.2 hole 0.9 slot 1.6 at 90 deg: SH(-9.15,-3.475) SH(-7.25,4.725) SH(7.25,4.725) SH(9.15,-4.725)
Top Overlay:
  circle w0.4: c-5.225,6 r0.2
  lines w0.15: -6.1,5.475 6.1,5.475
Keep-Out Layer:
  lines w0.2: -11,-3.475 -11,-6.365 -7.749,-6.365 -7.749,1.025 cw(c-7.749,1.525) -7.749,2.025 7.776,2.025 ; 7.749,-6.365 7.749,1.025 ccw(c7.749,1.525) 7.749,2.025 ; 7.776,-6.365 11,-6.365 11,-3.95
TopAssy 13:
  lines w0.15: -8.85,-4.2 -8.85,-2.725 ; -7.5,-4.2 -9.375,-4.2 -9.375,-2.725 -7.5,-2.725 ; -7.5,-8.065 7.5,-7.965 ; -7.5,1.725 -6.4,1.725 ; -7.5,4.15 -7.025,4.15 -7.025,5.325 -7.2,5.325 ; -4.997,-1.823 -4.7,-5.265 ccw(c-4.2,-5.265) -3.7,-5.265 -3.403,-1.827 ; -4.838,-3.665 -3.562,-3.665 ; -4.769,-4.465 -3.631,-4.465 ; 3.403,-1.823 3.7,-5.265 ccw(c4.2,-5.265) 4.7,-5.265 4.997,-1.818 ; 3.562,-3.665 4.838,-3.665 ; 3.631,-4.465 4.769,-4.465 ; 6.8,1.725 4.8,1.725 ; 6.9,5.325 7.025,5.325 7.025,4.225 7.5,4.225 ; 7.5,-5.475 9.375,-5.475 9.375,-4 7.5,-4 ; 7.5,1.725 6.4,1.725 5.9,1.225 5.3,1.225 4.8,1.725 ; 8.85,-5.475 8.85,-4 ; -6.4,1.725 -5.9,1.225 -5.4,1.225 -4.9,1.725 ; -6.4,1.725 -4.9,1.725 ; -4.9,1.725 4.8,1.725 ; -7.5,-8.525 7.5,-8.525 7.5,5.25 7.425,5.325 -7.5,5.325 -7.5,-8.525
TopCourt 15:
  lines w0.05: -0.5,0 0.5,0 ; 0,-0.475 0,0.475 ; -10.3,-8.9 10.3,-8.9 10.3,6.2 -10.3,6.2 -10.3,-8.9
3D body "c-2041433-1-b-3d.stp": height 1.94, standoff -4.32, extent -9.4,-8.525 9.4,5.325